# Altium footprint library UWRT_Footprint_Library_2020.PcbLib: 376 footprints (part 14 of 24)
Each footprint in its own frame and in the unit in brackets; x right, y up, seen from the top. Pads: shape width x height; smd on the part's side, far side on the other; paste and mask are expansions set on the pad; w line width, h text height; cw(c..) or ccw(c..) is an arc to the next point about the centre after c.
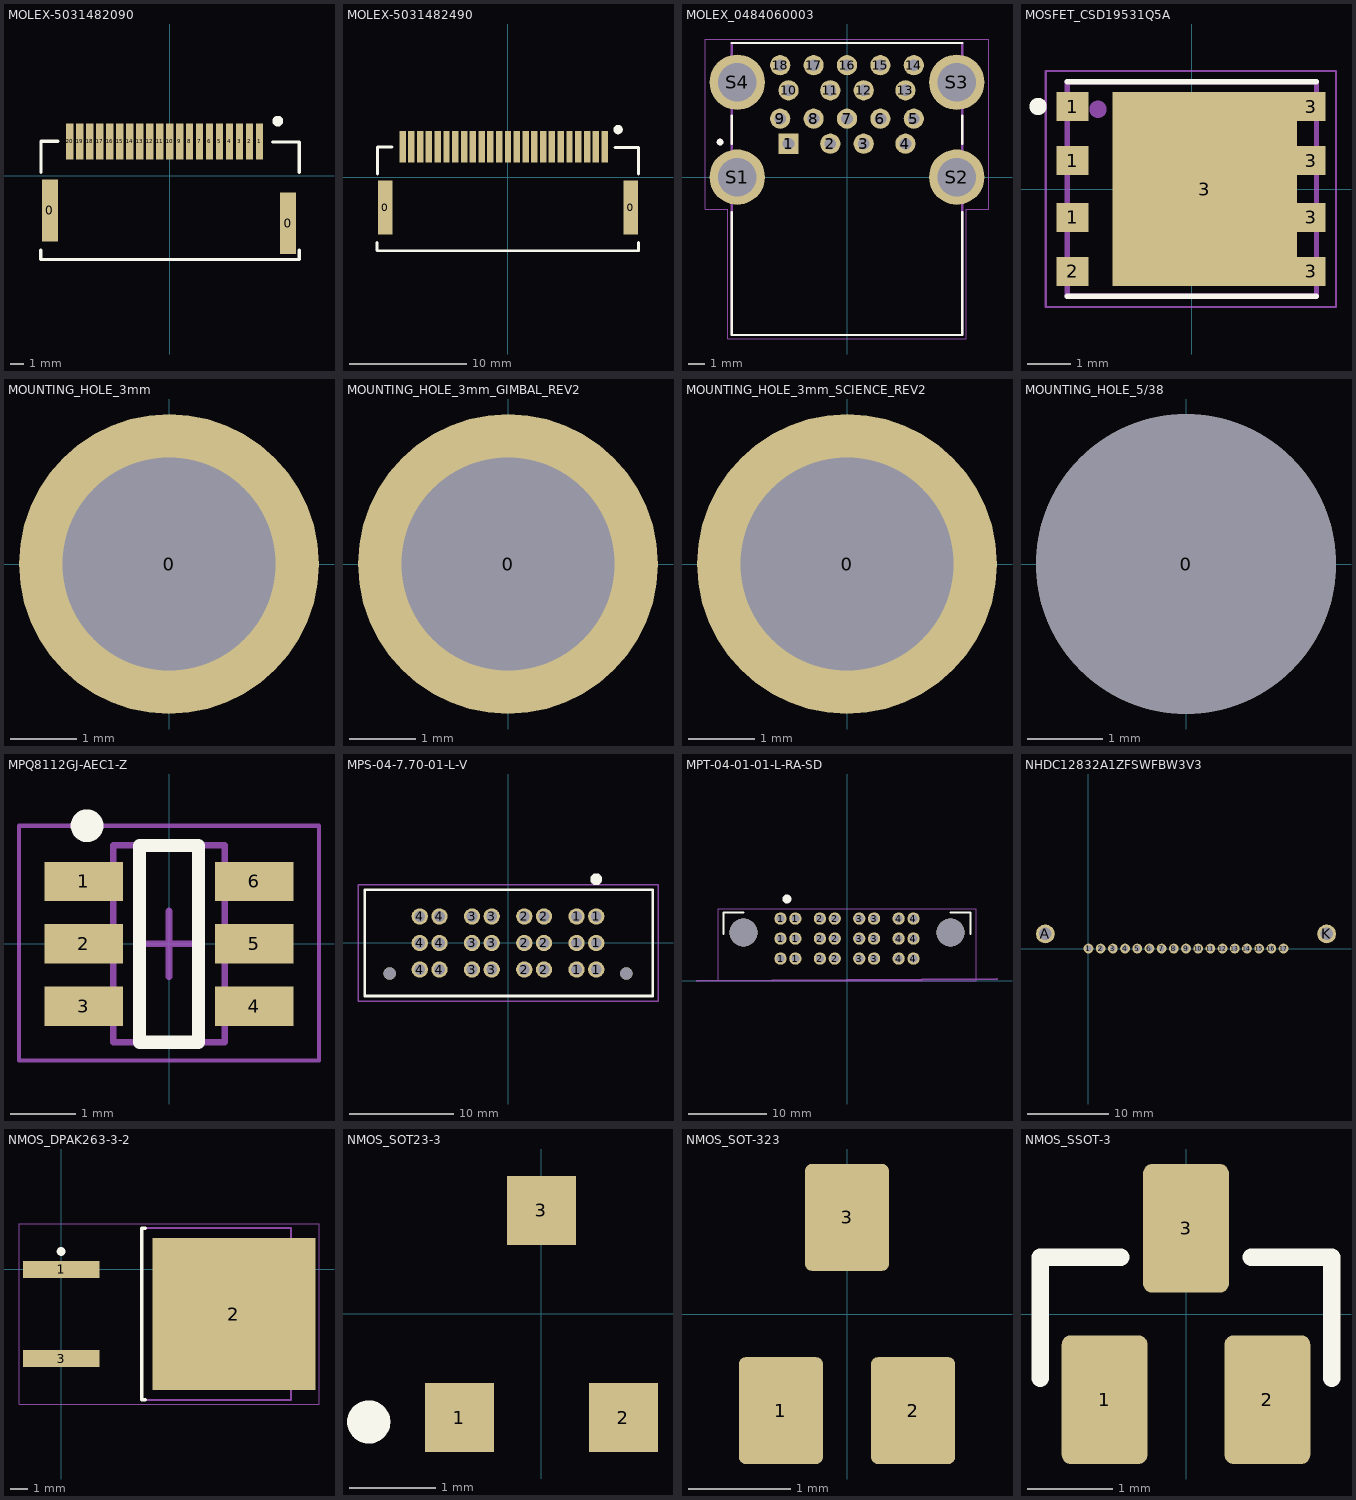
[diagram p13: the footprints below, top view; thin cyan lines are the x and y axes]

## MOLEX-5031482090 [mm] "Molex 5024940670 20 pin 1.5 mm pitch SMD RA connector"
pads (22):
  rect 1.2x4.65 smd: 0(-8.98,-2.587) 0(8.89,-3.556)
  rect 0.55x2.7 smd: 1(6.75,2.588) 2(6,2.588) 3(5.25,2.588) 4(4.5,2.588) 5(3.75,2.588) 6(3,2.588) 7(2.25,2.588) 8(1.5,2.588) 9(0.75,2.588) 10(0,2.588) 11(-0.75,2.588) 12(-1.5,2.588) 13(-2.25,2.588) 14(-3,2.588) 15(-3.75,2.588) 16(-4.5,2.588) 17(-5.25,2.588) 18(-6,2.588) 19(-6.75,2.588) 20(-7.5,2.588)
Top Overlay:
  circle w0.4: c8.121,4.112 r0.2
  lines w0.254: -9.676,-5.588 -9.676,-6.254 -9.65,-6.28 9.729,-6.28 9.729,-5.588 ; -9.65,0.28 -9.65,2.588 -8.406,2.588 ; 7.723,2.54 9.729,2.54 9.729,0.254
3D body "5031482090.stp": height 9.21, standoff 0.01, extent -9.65,-6.28 9.65,3.27

## MOLEX-5031482490 [mm] "Molex 5031482490 24 pin 1.5 mm pitch SMD RA connector"
pads (26):
  rect 1.2x4.65 smd mask+0.05: 0(-10.48,-2.588) 0(10.48,-2.588)
  rect 0.55x2.7 smd mask+0.05: 1(8.25,2.588) 2(7.5,2.588) 3(6.75,2.588) 4(6,2.588) 5(5.25,2.588) 6(4.5,2.588) 7(3.75,2.588) 8(3,2.588) 9(2.25,2.588) 10(1.5,2.588) 11(0.75,2.588) 12(0,2.588) 13(-0.75,2.588) 14(-1.5,2.588) 15(-2.25,2.588) 16(-3,2.588) 17(-3.75,2.588) 18(-4.5,2.588) 19(-5.25,2.588) 20(-6,2.588) 21(-6.75,2.588) 22(-7.5,2.588) 23(-8.25,2.588) 24(-9,2.588)
Top Overlay:
  circle w0.4: c9.398,4.064 r0.2
  lines w0.254: -11.176,-5.588 -11.176,-6.254 -11.15,-6.28 11.15,-6.28 11.15,-5.588 ; -11.15,0.28 -11.15,2.588 -9.906,2.588 ; 9.144,2.54 11.15,2.54 11.15,0.254
3D body "5031482490.stp": height 9.21, standoff 0.01, extent -11.15,-6.28 11.15,3.27

## MOLEX_0484060003 [mm]
pads (22):
  rect 1.208x1.208 hole 0.7: 1(-3.5,2)
  round 1.208 hole 0.7: 2(-1,2) 3(1,2) 4(3.5,2) 5(4,3.5) 6(2,3.5) 7(0,3.5) 8(-2,3.5) 9(-4,3.5) 10(-3.5,5.2) 11(-1,5.2) 12(1,5.2) 13(3.5,5.2) 14(4,6.7) 15(2,6.7) 16(0,6.7) 17(-2,6.7) 18(-4,6.7)
  round 3.316 hole 2.3: S1(-6.57,0) S2(6.57,0) S3(6.57,5.68) S4(-6.57,5.68)
Top Overlay:
  circle w0.2: c-7.6,2.1 r0.1
  lines w0.127: -6.9,-2.1 -6.9,-9.44 6.9,-9.44 6.9,-2.1 ; -6.9,2 -6.9,3.7 ; -6.9,8.02 6.9,8.02 ; 6.9,2 6.9,3.7
Mechanical 13:
  circle w0.2: c-7.6,2.1 r0.1
  lines w0.127: -6.9,-9.44 6.9,-9.44 6.9,8.02 -6.9,8.02 -6.9,-9.44
Mechanical 15:
  lines w0.05: -8.5,-1.92 -8.5,8.27 8.5,8.27 8.5,-1.92 7.15,-1.92 7.15,-9.69 -7.15,-9.69 -7.15,-1.92 -8.5,-1.92
3D body "484060003.stp": height 16.2, standoff -3.2, extent -7.874,-9.492 7.796,7.968

## MOSFET_CSD19531Q5A [mm]
pads (9):
  rect 0.75x0.675 smd paste-1: 1(-2.776,-0.66) 1(-2.776,0.66) 1(-2.776,1.917) 2(-2.776,-1.917)
  rect 4.295x4.51 smd paste-3: 3(0.301,0)
  rect 0.655x0.675 smd paste-1: 3(2.776,-1.917) 3(2.776,-0.66) 3(2.776,0.66) 3(2.776,1.917)
Top Overlay:
  circle w0.3: c-3.578,1.921 r0.05
  lines w0.127: -2.9,-2.5 2.9,-2.5 ; -2.9,2.5 2.9,2.5
Top Paste:
  region: -2.526,-2.171 -3.031,-2.171 -3.031,-1.667 -2.526,-1.667
  region: -2.526,-0.91 -3.026,-0.91 -3.026,-0.41 -2.526,-0.41
  region: -2.526,0.41 -3.027,0.41 -3.027,0.91 -2.526,0.91
  region: -2.526,1.67 -3.03,1.67 -3.03,2.167 -2.526,2.167
  region: 3.026,-2.172 2.531,-2.172 2.531,-1.667 3.026,-1.667
  region: 3.026,-0.91 2.528,-0.91 2.528,-0.41 3.026,-0.41
  region: 3.026,0.41 2.528,0.41 2.528,0.91 3.026,0.91
  region: 3.026,1.668 2.527,1.668 2.527,2.167 3.026,2.167
  region: 1.911,-1.882 0.327,-1.882 0.327,-0.31 1.911,-0.31
  region: -0.174,-1.883 -1.411,-1.883 -1.411,-0.31 -0.174,-0.31
  region: 1.911,0.31 0.327,0.31 0.327,1.88 1.911,1.88
  region: -0.174,0.31 -1.409,0.31 -1.409,1.88 -0.174,1.88
Mechanical 13:
  circle w0.3: c-2.186,1.855 r0.05
  lines w0.127: -2.9,-2.5 2.9,-2.5 2.9,2.5 -2.9,2.5 -2.9,-2.5
Mechanical 15:
  lines w0.05: -3.401,-2.75 3.354,-2.75 3.354,2.75 -3.401,2.75 -3.401,-2.75
3D body "CSD17577Q5AT.STEP": height 1.1, standoff 0, extent -3,-2.45 3,2.45

## MOUNTING_HOLE_3mm [mm] "3mm Hole"
pads (1):
  round 4.5 hole 3.2 mask+0.3: 0(0,0)

## MOUNTING_HOLE_3mm_GIMBAL_REV2 [mm] "3mm Hole"
pads (1):
  round 4.5 / inner round 4.5 / far side round 5.25 hole 3.2 mask+0.3: 0(0,0)

## MOUNTING_HOLE_3mm_SCIENCE_REV2 [mm] "3mm Hole"
pads (1):
  round 4.5 / inner round 4.5 / far side round 6 hole 3.2 mask+0.3: 0(0,0)

## MOUNTING_HOLE_5/38 [mm] "Meant to use with Mcmaster-carr PN: 91443A250"
pads (1):
  round 3.97 hole 3.97 unplated mask+0.3: 0(0,0)

## MPQ8112GJ-AEC1-Z [mm] "SOT23, 6-Leads, Body 2.90x2.40mm, Pitch 0.95mm, IPC Medium Density"
height 1
pads (6):
  rect 1.2x0.6 smd: 1(-1.3,0.95) 2(-1.3,0) 3(-1.3,-0.95) 4(1.3,-0.95) 5(1.3,0) 6(1.3,0.95)
Top Overlay:
  circle w0.25: c-1.25,1.8 r0.125
  lines w0.2: -0.45,-1.5 -0.45,1.5 0.45,1.5 0.45,-1.5 -0.45,-1.5
Mechanical 13:
  lines w0.1: -0.85,-1.5 0.85,-1.5 0.85,1.5 -0.85,1.5 -0.85,-1.5
Mechanical 15:
  lines w0.064: -2.286,-1.778 2.286,-1.778 2.286,1.8 -2.286,1.8 -2.286,-1.778
  lines w0.1: -0.5,0 0.5,0 ; 0,-0.5 0,0.5
3D body "MPQ8112GJ-AEC1-Z.step": height 1, standoff 0, extent -1.275,-1.5 1.275,1.5

## MPS-04-7.70-01-L-V [mm]
pads (26):
  round 1.56 hole 1.04: 1(6.56,-2.54) 1(6.56,0) 1(6.56,2.54) 1(8.44,-2.54) 1(8.44,0) 1(8.44,2.54) 2(1.56,-2.54) 2(1.56,0) 2(1.56,2.54) 2(3.44,-2.54) 2(3.44,0) 2(3.44,2.54) 3(-3.44,-2.54) 3(-3.44,0) 3(-3.44,2.54) 3(-1.56,-2.54) 3(-1.56,0) 3(-1.56,2.54) 4(-8.44,-2.54) 4(-8.44,0) 4(-8.44,2.54) 4(-6.56,-2.54) 4(-6.56,0) 4(-6.56,2.54)
  round 1.19 hole 1.19 unplated: ""(-11.32,-2.92) ""(11.32,-2.92)
Top Overlay:
  circle w0.635: c8.44,6.096 r0.254
  lines w0.254: -13.716,-5.08 13.834,-5.08 13.834,5.08 -13.716,5.08 -13.716,-5.08
Mechanical 15:
  lines w0.127: -14.351,-5.588 14.351,-5.588 14.351,5.588 -14.351,5.588 -14.351,-5.588
3D body "MPS-04-7_70-01-L-V.stp": height 10.16, standoff -2.64, extent -13.716,-5.08 13.834,5.08

## MPT-04-01-01-L-RA-SD [mm]
pads (26):
  round 1.56 hole 1.04 paste-2539.97: 1(-8.44,2.85) 1(-6.56,2.85) 2(-3.44,2.85) 2(-1.56,2.85) 3(1.56,2.85) 3(3.44,2.85) 4(6.56,2.85) 4(8.44,2.85)
  round 1.56 hole 1.04: 1(-8.44,5.39) 1(-8.44,7.93) 1(-6.56,5.39) 1(-6.56,7.93) 2(-3.44,5.39) 2(-3.44,7.93) 2(-1.56,5.39) 2(-1.56,7.93) 3(1.56,5.39) 3(1.56,7.93) 3(3.44,5.39) 3(3.44,7.93) 4(6.56,5.39) 4(6.56,7.93) 4(8.44,5.39) 4(8.44,7.93)
  round 3.56 hole 3.56 unplated: ""(-13.14,6.15) ""(13.14,6.15)
Top Overlay:
  circle w0.635: c-7.62,10.414 r0.254
  lines w0.254: -15.68,5.942 -15.68,8.71 -13.14,8.71 ; 13.14,8.71 15.68,8.71 15.68,5.942
Mechanical 15:
  lines w0.127: -16.383,0 16.383,0 16.383,9.144 -16.383,9.144 -16.383,0
  lines w0.254: -19.05,0 19.05,0.254
  text "CONN OVERHANG" at -9.906,-2.286 h1.52
3D body "MPT-04-01-01-L-RA-SD.stp": height 10.89, standoff -2.63, extent -15.68,-6.1 15.68,8.71

## NHDC12832A1ZFSWFBW3V3 [mm]
pads (19):
  round 1.2 hole 0.7 mask+0.203: 1(0,0) 2(1.5,0) 3(3,0) 4(4.5,0) 5(6,0) 6(7.5,0) 7(9,0) 8(10.5,0) 9(12,0) 10(13.5,0) 11(15,0) 12(16.5,0) 13(18,0) 14(19.5,0) 15(21,0) 16(22.5,0) 17(24,0)
  round 2.31 / inner round 1.524 / far side round 2.31 hole 1.54 mask+0.203: A(-5.3,1.8) K(29.3,1.8)
3D body "NHD-C12832A1Z.STEP": height 4, standoff -3, extent -8.659,-0.72 32.741,23.58

## NMOS_DPAK263-3-2 [mm] "D2-PAK, 3-Pads, Body 7.36x8.26mm (max), IPC Medium Density"
height 4.57
pads (3):
  rect 4.35x0.95 smd: 1(0,0) 3(0,-5.08)
  rect 9.3x8.65 smd: 2(9.85,-2.54)
Top Overlay:
  circle w0.25: c0,1.025 r0.125
  lines w0.2: 4.8,-7.44 4.6,-7.44 4.6,2.36 4.8,2.36
Mechanical 13:
  lines w0.1: 4.6,-7.44 13.11,-7.44 13.11,2.36 4.6,2.36 4.6,-7.44
Mechanical 15:
  lines w0.05: -2.4,-7.69 14.7,-7.69 14.7,2.61 -2.4,2.61 -2.4,-7.69
  lines w0.1: 5.65,-2.54 6.65,-2.54 ; 6.15,-3.04 6.15,-2.04
3D body "DPAK254P1524X457-3N.step": height 4.57, standoff 0, extent -0.835,-7.44 14.41,2.36

## NMOS_SOT23-3 [mm] "SOT23, 3 pins, Body 2.90mm x 2.80mm"
height 1.1
pads (3):
  rect 0.8x0.8 smd: 1(-0.95,-1.2) 2(0.95,-1.2) 3(0,1.2)
Top Overlay:
  circle w0.25: c-2,-1.25 r0.125
3D body "User Library-3-lead sot23-3.step": height 1, standoff -0.02, extent -1.46,-1.25 1.46,1.226

## NMOS_SOT-323 [mm]
pads (3):
  rrect15% 0.825x1.05 smd: 1(-0.65,-0.95) 2(0.65,-0.95) 3(0,0.95)
3D body "DMN3067LW-7.stp": height 1.1, standoff 0, extent -1,-1.05 1,1.05

## NMOS_SSOT-3 [mm] "FDN337N"
pads (3):
  rrect20% 1x1.5 smd: 1(-0.95,-1) 2(0.95,-1) 3(0,1)
Top Overlay:
  lines w0.203: -1.7,-0.75 -1.7,0.66 -0.764,0.66 ; 0.764,0.66 1.7,0.66 1.7,-0.75
3D body "NDS355AN--3DModel-STEP-56544.STEP": height 1.12, standoff 0, extent -1.46,-1.407 1.46,1.103